# Altium footprint library MyPcbLib.PcbLib: 657 footprints (part 13 of 42)
Each footprint in its own frame and in the unit in brackets; x right, y up, seen from the top. Pads: shape width x height; smd on the part's side, far side on the other; paste and mask are expansions set on the pad; w line width, h text height; cw(c..) or ccw(c..) is an arc to the next point about the centre after c.
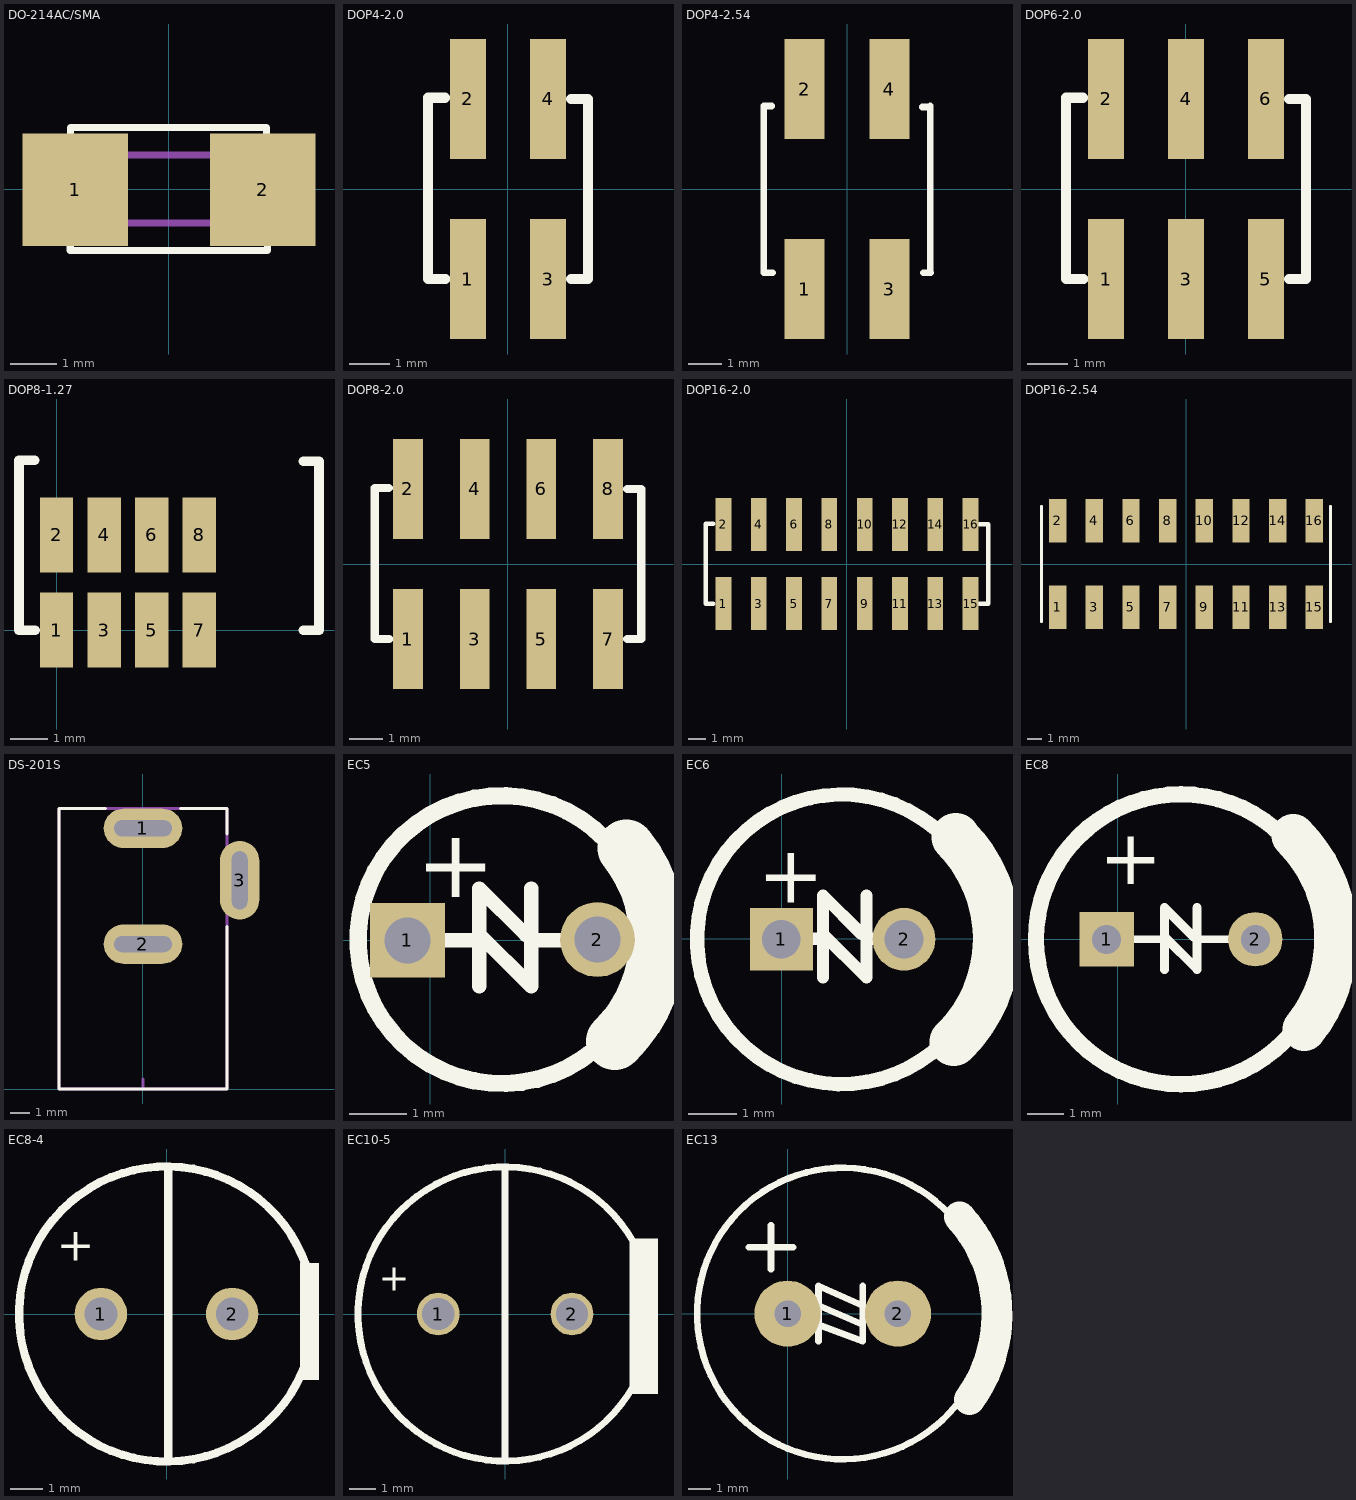
[diagram p12: the footprints below, top view; thin cyan lines are the x and y axes]

## DO-214AC/SMA [mil]
pads (2):
  rect 90x96 smd: 1(-79.76,-0.38) 2(80.24,-0.38)
Top Overlay:
  lines w6: -84.04,-45.61 -84.04,-52.34 0.1,-52.34 84.16,-52.34 84.16,-45.14 ; -83.76,45.66 -83.76,52.59 0.1,52.59 83.24,52.59 83.24,45.66
Mechanical 1:
  lines w6: -100.39,0.13 -100.39,29.22 101.39,29.22 101.39,-28.97 -100.41,-28.97 -100.41,2.31

## DOP4-2.0 [mm]
pads (4):
  rect 0.89x3 smd: 1(-1,-2.25) 2(-1,2.25) 3(1,-2.25) 4(1,2.25)
Top Overlay:
  lines w0.254: -2,2.25 -2,-2.25 -1.567,-2.25 ; -2,2.28 -1.581,2.28 ; 1.581,-2.25 2,-2.25 2,2.25 1.581,2.25
3D body: height 6.5, standoff -0.05, extent -1.93,-2.464 2.07,2.536

## DOP4-2.54 [mm]
pads (4):
  rect 1.2x3 smd: 1(-1.27,-3) 2(-1.27,3) 3(1.27,-3) 4(1.27,3)
Top Overlay:
  lines w0.203: -2.5,-2.5 -2.5,2.5 ; -2.489,-2.515 -2.235,-2.515 ; -2.489,2.489 -2.261,2.489 ; 2.261,2.464 2.5,2.464 ; 2.286,-2.515 2.515,-2.515 ; 2.5,-2.5 2.5,2.5

## DOP6-2.0 [mm]
pads (6):
  rect 0.89x3 smd: 1(-2,-2.25) 2(-2,2.25) 3(0,-2.25) 4(0,2.25) 5(2,-2.25) 6(2,2.25)
Top Overlay:
  lines w0.254: -3,2.25 -3,-2.25 -2.567,-2.25 ; -3,2.28 -2.581,2.28 ; 2.581,-2.25 3,-2.25 3,2.25 2.581,2.25

## DOP8-1.27 [mm]
pads (8):
  rect 0.89x2 smd: 1(0,0) 2(0,2.54) 3(1.27,0) 4(1.27,2.54) 5(2.54,0) 6(2.54,2.54) 7(3.81,0) 8(3.81,2.54)
Top Overlay:
  lines w0.254: -1,4.5 -1,0 -0.567,0 ; -1,4.53 -0.581,4.53 ; 6.581,0 7,0 7,4.5 6.581,4.5

## DOP8-2.0 [mm]
pads (8):
  rect 0.89x3 smd: 1(-3,-2.25) 2(-3,2.25) 3(-1,-2.25) 4(-1,2.25) 5(1,-2.25) 6(1,2.25) 7(3,-2.25) 8(3,2.25)
Top Overlay:
  lines w0.254: -4,2.25 -4,-2.25 -3.567,-2.25 ; -4,2.28 -3.581,2.28 ; 3.581,-2.25 4,-2.25 4,2.25 3.581,2.25

## DOP16-2.0 [mm]
pads (16):
  rect 0.89x3 smd: 1(-7,-2.25) 2(-7,2.25) 3(-5,-2.25) 4(-5,2.25) 5(-3,-2.25) 6(-3,2.25) 7(-1,-2.25) 8(-1,2.25) 9(1,-2.25) 10(1,2.25) 11(3,-2.25) 12(3,2.25) 13(5,-2.25) 14(5,2.25) 15(7,-2.25) 16(7,2.25)
Top Overlay:
  lines w0.254: -8,2.25 -8,-2.25 -7.567,-2.25 ; -8,2.28 -7.581,2.28 ; 7.5,-2.25 8,-2.25 8,2.25 7.5,2.25
3D body: height 6.5, standoff -0.05, extent -7.999,-2.261 8.001,2.739

## DOP16-2.54 [mm] "Connector; Header; 8x2 Position"
pads (16):
  rect 1.2x3 smd: 1(-8.89,-3) 2(-8.89,3) 3(-6.35,-3) 4(-6.35,3) 5(-3.81,-3) 6(-3.81,3) 7(-1.27,-3) 8(-1.27,3) 9(1.27,-3) 10(1.27,3) 11(3.81,-3) 12(3.81,3) 13(6.35,-3) 14(6.35,3) 15(8.89,-3) 16(8.89,3)
Top Overlay:
  lines w0.2: -10,-4 -10,4 ; 10,-4 10,4

## DS-201S [mil]
pads (3):
  oval 160x80 hole 32 slot 118.11 at 0 deg paste+0 mask+2: 1(0,531) 2(0,295)
  oval 80x160 hole 32 slot 118.11 at 90 deg paste+0 mask+2: 3(197,425)
Top Overlay:
  lines w6: -76,571 -171,571 -171,0 171,0 171,331 ; 76,571 171,571 171,519
Mechanical 1:
  lines w6: 0,0 0,20 ; -171,0 -171,571 171,571 171,0 -171,0
Mechanical 2:
  lines w6: -39,279 cw(c-39,295) -39,311 39,311 cw(c39,295) 39,279 -39,279 ; -39,515 cw(c-39,531) -39,547 39,547 cw(c39,531) 39,515 -39,515 ; 181,386 ccw(c197,386) 213,386 213,464 ccw(c197,464) 181,464 181,386

## EC5 [mm]
pads (2):
  rect 1.3x1.3 / inner rect 1.3x1.3 / far side rect 1.6x2.2 hole 0.8: 1(-0.4,0)
  round 1.3 / inner round 1.3 / far side oval 1.6x2.2 hole 0.8: 2(2.9,0.012)
Top Overlay:
  circle w0.3: c1.242,0.012 r2.5
  lines w0.25: -0.25,0 0.75,0 ; 0.85,-0.8 0.85,0.9 1.65,0.1 ; 0.85,0.1 1.75,-0.8 1.75,0.9 ; 1.85,0 2.85,0
  lines w1: 3.199,-1.755 ccw(c1.452,0.033) 3.4,1.6
  text "+" at -0.25,0.75 h1.2

## EC6 [mm]
pads (2):
  rect 1.3x1.3 / inner rect 1.3x1.3 / far side rect 1.8x2.2 hole 0.8: 1(-0.009,-0.011)
  round 1.3 / inner round 1.3 / far side oval 1.8x2.2 hole 0.8: 2(2.531,-0.011)
Top Overlay:
  circle w0.3: c1.243,-0.011 r3
  lines w0.25: -0.25,0 0.75,0 ; 0.85,-0.8 0.85,0.9 1.65,0.1 ; 0.85,0.1 1.75,-0.8 1.75,0.9 ; 1.85,0 2.85,0
  lines w1: 3.563,-2.136 ccw(c1.457,0.001) 3.6,2.1
  text "+" at -0.5,0.75 h1.2

## EC8 [mm]
pads (2):
  rect 1.5x1.5 / inner rect 1.5x1.5 / far side rect 2.2x2.5 hole 0.8: 1(-0.3,0)
  round 1.5 / inner round 1.5 / far side oval 2.2x2.5 hole 0.8: 2(3.8,0)
Top Overlay:
  circle w0.45: c1.75,0 r4
  lines w0.2: 0.375,0 1.296,0 ; 2.196,0 3.5,0
  lines w0.25: 1.296,-0.83 1.296,0.87 2.096,0.07 ; 1.296,0.07 2.196,-0.83 2.196,0.87
  lines w1.2: 4.85,2.85 cw(c2.027,0.015) 5.152,-2.481
  text "+" at -0.508,1.524 h1.52

## EC8-4 [mm]
pads (2):
  round 1.6 / inner round 1.6 / far side round 2 hole 1: 1(-2,0) 2(2,0)
Top Overlay:
  circle w0.254: c0,0 r4.5
  rectangle: 4.064,-2.007 4.648,1.549
  lines w0.254: 0.051,-4.47 0.051,4.445
  text "+" at -3.353,1.626 h1.02

## EC10-5 [mm]
pads (2):
  round 1.6 / inner round 1.6 / far side round 2 hole 1.2: 1(-2.5,0) 2(2.5,0)
Top Overlay:
  circle w0.254: c0,0 r5.5
  rectangle: 4.648,-2.997 5.715,2.819
  lines w0.254: 0,-5.5 0,5.5
  text "+" at -4.724,0.864 h1.02

## EC13 [mm]
pads (2):
  round 3 hole 1.2: 1(0,0) 2(5,0)
Top Overlay:
  circle w0.3: c2.5,0 r6.6
  lines w0.3: -1.75,3 0.25,3 ; -0.75,2 -0.75,4 ; 0.4,0 1.4,0 ; 1.4,-1.25 1.4,1.25 3.4,0.375 ; 1.4,-0.5 3.4,-1.25 3.4,1.25 ; 1.4,0.375 3.4,-0.5 ; 3.4,0 4.4,0
  lines w1.4: 7.784,4.385 cw(c2.883,-0.036) 8.242,-3.89

## EC16 [mm]